# Altium footprint library Connectors.PcbLib: 43 footprints (part 3 of 3)
Each footprint in its own frame and in the unit in brackets; x right, y up, seen from the top. Pads: shape width x height; smd on the part's side, far side on the other; paste and mask are expansions set on the pad; w line width, h text height; cw(c..) or ccw(c..) is an arc to the next point about the centre after c.
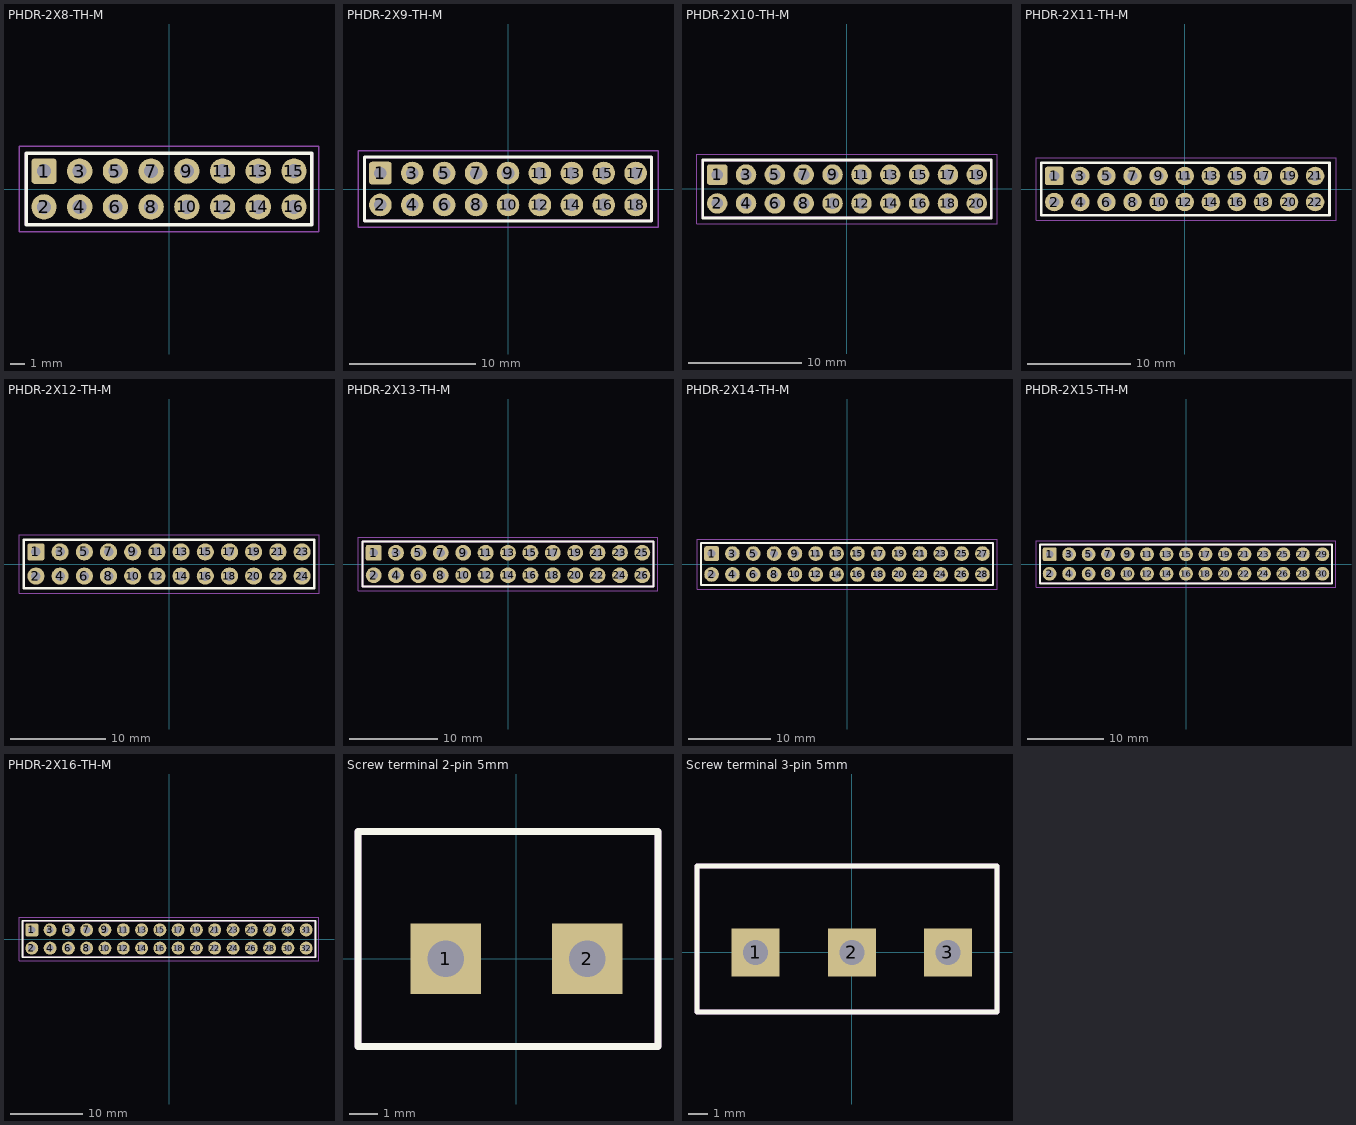
[diagram p2: the footprints below, top view; thin cyan lines are the x and y axes]

## PHDR-2X8-TH-M [mm] "PinHeader 2x8 TH Pitch 2.54mm"
height 9.5
pads (16):
  rrect25% 1.8x1.8 hole 1: 1(-8.89,1.27)
  round 1.8 hole 1: 2(-8.89,-1.27) 3(-6.35,1.27) 4(-6.35,-1.27) 5(-3.81,1.27) 6(-3.81,-1.27) 7(-1.27,1.27) 8(-1.27,-1.27) 9(1.27,1.27) 10(1.27,-1.27) 11(3.81,1.27) 12(3.81,-1.27) 13(6.35,1.27) 14(6.35,-1.27) 15(8.89,1.27) 16(8.89,-1.27)
Top Overlay:
  lines w0.254: -7.62,2.54 -10.16,2.54 ; -10.16,2.54 -10.16,0 -10.16,-2.54 10.16,-2.54 10.16,2.54 -10.16,2.54
Top Assembly:
  circle w0.5: c-8.89,1.27 r0.15
  lines w0.2: -10.16,-2.54 -10.16,2.54 10.16,2.54 10.16,-2.54 -10.16,-2.54
Top Courtyard:
  lines w0.1: -10.668,-3.048 10.668,-3.048 10.668,3.048 -10.668,3.048 -10.668,-3.048
Top Designator:
  text ".Designator" at -7.498,-0.5 h1.5
3D body "Pin Header 2x8 TH Pitch 2.54mm.stp": height 9.5, standoff -3.2, extent -10.16,-2.54 10.16,2.54

## PHDR-2X9-TH-M [mm] "PinHeader 2x9 TH Pitch 2.54mm"
height 9.5
pads (18):
  rrect25% 1.8x1.8 hole 1: 1(-10.16,1.27)
  round 1.8 hole 1: 2(-10.16,-1.27) 3(-7.62,1.27) 4(-7.62,-1.27) 5(-5.08,1.27) 6(-5.08,-1.27) 7(-2.54,1.27) 8(-2.54,-1.27) 9(0,1.27) 10(0,-1.27) 11(2.54,1.27) 12(2.54,-1.27) 13(5.08,1.27) 14(5.08,-1.27) 15(7.62,1.27) 16(7.62,-1.27) 17(10.16,1.27) 18(10.16,-1.27)
Top Overlay:
  lines w0.254: -8.89,2.54 -11.43,2.54 ; -11.43,2.54 11.43,2.54 11.43,-2.54 -11.43,-2.54 -11.43,0 -11.43,2.54
Top Assembly:
  circle w0.5: c-10.16,1.27 r0.15
  lines w0.2: -11.43,-2.54 -11.43,2.54 11.43,2.54 11.43,-2.54 -11.43,-2.54
Top Courtyard:
  lines w0.1: -11.938,-3.048 -11.938,3.048 11.938,3.048 11.938,-3.048 -11.938,-3.048
Top Designator:
  text ".Designator" at -7.498,-0.5 h1.5
3D body "Pin Header 2x9 TH Pitch 2.54mm.stp": height 9.5, standoff -3.2, extent -11.43,-2.54 11.43,2.54

## PHDR-2X10-TH-M [mm] "PinHeader 2x10 TH Pitch 2.54mm"
height 9.5
pads (20):
  rrect25% 1.8x1.8 hole 1: 1(-11.43,1.27)
  round 1.8 hole 1: 2(-11.43,-1.27) 3(-8.89,1.27) 4(-8.89,-1.27) 5(-6.35,1.27) 6(-6.35,-1.27) 7(-3.81,1.27) 8(-3.81,-1.27) 9(-1.27,1.27) 10(-1.27,-1.27) 11(1.27,1.27) 12(1.27,-1.27) 13(3.81,1.27) 14(3.81,-1.27) 15(6.35,1.27) 16(6.35,-1.27) 17(8.89,1.27) 18(8.89,-1.27) 19(11.43,1.27) 20(11.43,-1.27)
Top Overlay:
  lines w0.254: -10.16,2.54 -12.7,2.54 ; -12.7,2.54 12.7,2.54 12.7,-2.54 -12.7,-2.54 -12.7,0 -12.7,2.54
Top Assembly:
  circle w0.5: c-11.43,1.27 r0.15
  lines w0.2: -12.7,-2.54 12.7,-2.54 12.7,2.54 -12.7,2.54 -12.7,-2.54
Top Courtyard:
  lines w0.1: -13.208,-3.048 13.208,-3.048 13.208,3.048 -13.208,3.048 -13.208,-3.048
Top Designator:
  text ".Designator" at -7.498,-0.5 h1.5
3D body "Pin Header 2x10 TH Pitch 2.54mm.stp": height 9.5, standoff -3.2, extent -12.7,-2.54 12.7,2.54

## PHDR-2X11-TH-M [mm] "PinHeader 2x11 TH Pitch 2.54mm"
height 9.5
pads (22):
  rrect25% 1.8x1.8 hole 1: 1(-12.7,1.27)
  round 1.8 hole 1: 2(-12.7,-1.27) 3(-10.16,1.27) 4(-10.16,-1.27) 5(-7.62,1.27) 6(-7.62,-1.27) 7(-5.08,1.27) 8(-5.08,-1.27) 9(-2.54,1.27) 10(-2.54,-1.27) 11(0,1.27) 12(0,-1.27) 13(2.54,1.27) 14(2.54,-1.27) 15(5.08,1.27) 16(5.08,-1.27) 17(7.62,1.27) 18(7.62,-1.27) 19(10.16,1.27) 20(10.16,-1.27) 21(12.7,1.27) 22(12.7,-1.27)
Top Overlay:
  lines w0.254: -11.43,2.54 -13.97,2.54 ; -13.97,2.54 -13.97,0 -13.97,-2.54 14.097,-2.54 14.097,2.54 -13.97,2.54
Top Assembly:
  circle w0.5: c-12.7,1.27 r0.15
  lines w0.2: -13.97,-2.54 14.097,-2.54 14.097,2.54 -13.97,2.54 -13.97,-2.54
Top Courtyard:
  lines w0.1: -14.478,-3.048 14.732,-3.048 14.732,3.048 -14.478,3.048 -14.478,-3.048
Top Designator:
  text ".Designator" at -7.498,-0.5 h1.5
3D body "Pin Header 2x11 TH Pitch 2.54mm.stp": height 9.5, standoff -3.2, extent -13.97,-2.54 13.97,2.54

## PHDR-2X12-TH-M [mm] "PinHeader 2x12 TH Pitch 2.54mm"
height 9.5
pads (24):
  rrect25% 1.8x1.8 hole 1: 1(-13.97,1.27)
  round 1.8 hole 1: 2(-13.97,-1.27) 3(-11.43,1.27) 4(-11.43,-1.27) 5(-8.89,1.27) 6(-8.89,-1.27) 7(-6.35,1.27) 8(-6.35,-1.27) 9(-3.81,1.27) 10(-3.81,-1.27) 11(-1.27,1.27) 12(-1.27,-1.27) 13(1.27,1.27) 14(1.27,-1.27) 15(3.81,1.27) 16(3.81,-1.27) 17(6.35,1.27) 18(6.35,-1.27) 19(8.89,1.27) 20(8.89,-1.27) 21(11.43,1.27) 22(11.43,-1.27) 23(13.97,1.27) 24(13.97,-1.27)
Top Overlay:
  lines w0.254: -12.7,2.54 -15.24,2.54 ; -15.24,2.54 -15.24,0 -15.24,-2.54 15.24,-2.54 15.24,2.54 -15.24,2.54
Top Assembly:
  circle w0.5: c-13.97,1.27 r0.15
  lines w0.2: -15.24,-2.54 -15.24,2.54 15.24,2.54 15.24,-2.54 -15.24,-2.54
Top Courtyard:
  lines w0.1: -15.748,-3.048 -15.748,3.048 15.748,3.048 15.748,-3.048 -15.748,-3.048
Top Designator:
  text ".Designator" at -7.498,-0.5 h1.5
3D body "Pin Header 2x12 TH Pitch 2.54mm.stp": height 9.5, standoff -3.2, extent -15.24,-2.54 15.24,2.54

## PHDR-2X13-TH-M [mm] "PinHeader 2x13 TH Pitch 2.54mm"
height 9.5
pads (26):
  rrect25% 1.8x1.8 hole 1: 1(-15.24,1.27)
  round 1.8 hole 1: 2(-15.24,-1.27) 3(-12.7,1.27) 4(-12.7,-1.27) 5(-10.16,1.27) 6(-10.16,-1.27) 7(-7.62,1.27) 8(-7.62,-1.27) 9(-5.08,1.27) 10(-5.08,-1.27) 11(-2.54,1.27) 12(-2.54,-1.27) 13(0,1.27) 14(0,-1.27) 15(2.54,1.27) 16(2.54,-1.27) 17(5.08,1.27) 18(5.08,-1.27) 19(7.62,1.27) 20(7.62,-1.27) 21(10.16,1.27) 22(10.16,-1.27) 23(12.7,1.27) 24(12.7,-1.27) 25(15.24,1.27) 26(15.24,-1.27)
Top Overlay:
  lines w0.254: -13.97,2.54 -16.51,2.54 ; -16.51,2.54 -16.51,0 -16.51,-2.54 16.51,-2.54 16.51,2.54 -16.51,2.54
Top Assembly:
  circle w0.5: c-15.24,1.27 r0.15
  lines w0.2: -16.51,-2.54 16.51,-2.54 16.51,2.54 -16.51,2.54 -16.51,-2.54
Top Courtyard:
  lines w0.1: -17.018,-3.048 17.018,-3.048 17.018,3.048 -17.018,3.048 -17.018,-3.048
Top Designator:
  text ".Designator" at -7.498,-0.5 h1.5
3D body "Pin Header 2x13 TH Pitch 2.54mm.stp": height 9.5, standoff -3.2, extent -16.51,-2.54 16.51,2.54

## PHDR-2X14-TH-M [mm] "PinHeader 2x14 TH Pitch 2.54mm"
height 9.5
pads (28):
  rrect25% 1.8x1.8 hole 1: 1(-16.51,1.27)
  round 1.8 hole 1: 2(-16.51,-1.27) 3(-13.97,1.27) 4(-13.97,-1.27) 5(-11.43,1.27) 6(-11.43,-1.27) 7(-8.89,1.27) 8(-8.89,-1.27) 9(-6.35,1.27) 10(-6.35,-1.27) 11(-3.81,1.27) 12(-3.81,-1.27) 13(-1.27,1.27) 14(-1.27,-1.27) 15(1.27,1.27) 16(1.27,-1.27) 17(3.81,1.27) 18(3.81,-1.27) 19(6.35,1.27) 20(6.35,-1.27) 21(8.89,1.27) 22(8.89,-1.27) 23(11.43,1.27) 24(11.43,-1.27) 25(13.97,1.27) 26(13.97,-1.27) 27(16.51,1.27) 28(16.51,-1.27)
Top Overlay:
  lines w0.254: -15.24,2.54 -17.78,2.54 ; -17.78,2.54 17.78,2.54 17.78,-2.54 -17.78,-2.54 -17.78,0 -17.78,2.54
Top Assembly:
  circle w0.5: c-16.51,1.27 r0.15
  lines w0.2: -17.78,-2.54 -17.78,2.54 17.78,2.54 17.78,-2.54 -17.78,-2.54
Top Courtyard:
  lines w0.1: -18.288,-3.048 -18.288,3.048 18.288,3.048 18.288,-3.048 -18.288,-3.048
Top Designator:
  text ".Designator" at -7.498,-0.5 h1.5
3D body "Pin Header 2x14 TH Pitch 2.54mm.stp": height 9.5, standoff -3.2, extent -17.78,-2.54 17.78,2.54

## PHDR-2X15-TH-M [mm] "PinHeader 2x15 TH Pitch 2.54mm"
height 9.5
pads (30):
  rrect25% 1.8x1.8 hole 1: 1(-17.78,1.27)
  round 1.8 hole 1: 2(-17.78,-1.27) 3(-15.24,1.27) 4(-15.24,-1.27) 5(-12.7,1.27) 6(-12.7,-1.27) 7(-10.16,1.27) 8(-10.16,-1.27) 9(-7.62,1.27) 10(-7.62,-1.27) 11(-5.08,1.27) 12(-5.08,-1.27) 13(-2.54,1.27) 14(-2.54,-1.27) 15(0,1.27) 16(0,-1.27) 17(2.54,1.27) 18(2.54,-1.27) 19(5.08,1.27) 20(5.08,-1.27) 21(7.62,1.27) 22(7.62,-1.27) 23(10.16,1.27) 24(10.16,-1.27) 25(12.7,1.27) 26(12.7,-1.27) 27(15.24,1.27) 28(15.24,-1.27) 29(17.78,1.27) 30(17.78,-1.27)
Top Overlay:
  lines w0.254: -16.51,2.54 -19.05,2.54 ; -19.05,2.54 -19.05,0 -19.05,-2.54 19.05,-2.54 19.05,2.54 -19.05,2.54
Top Assembly:
  circle w0.5: c-17.78,1.27 r0.15
  lines w0.2: -19.05,-2.54 19.05,-2.54 19.05,2.54 -19.05,2.54 -19.05,-2.54
Top Courtyard:
  lines w0.1: -19.558,-3.048 19.558,-3.048 19.558,3.048 -19.558,3.048 -19.558,-3.048
Top Designator:
  text ".Designator" at -7.498,-0.5 h1.5
3D body "Pin Header 2x15 TH Pitch 2.54mm.stp": height 9.5, standoff -3.2, extent -19.05,-2.54 19.05,2.54

## PHDR-2X16-TH-M [mm] "PinHeader 2x16 TH Pitch 2.54mm"
height 9.5
pads (32):
  rrect25% 1.8x1.8 hole 1: 1(-19.05,1.27)
  round 1.8 hole 1: 2(-19.05,-1.27) 3(-16.51,1.27) 4(-16.51,-1.27) 5(-13.97,1.27) 6(-13.97,-1.27) 7(-11.43,1.27) 8(-11.43,-1.27) 9(-8.89,1.27) 10(-8.89,-1.27) 11(-6.35,1.27) 12(-6.35,-1.27) 13(-3.81,1.27) 14(-3.81,-1.27) 15(-1.27,1.27) 16(-1.27,-1.27) 17(1.27,1.27) 18(1.27,-1.27) 19(3.81,1.27) 20(3.81,-1.27) 21(6.35,1.27) 22(6.35,-1.27) 23(8.89,1.27) 24(8.89,-1.27) 25(11.43,1.27) 26(11.43,-1.27) 27(13.97,1.27) 28(13.97,-1.27) 29(16.51,1.27) 30(16.51,-1.27) 31(19.05,1.27) 32(19.05,-1.27)
Top Overlay:
  lines w0.254: -17.78,2.54 -20.32,2.54 ; -20.32,2.54 -20.32,0 -20.32,-2.54 20.32,-2.54 20.32,2.54 -20.32,2.54
Top Assembly:
  circle w0.5: c-19.05,1.27 r0.15
  lines w0.2: -20.32,-2.54 -20.32,2.54 20.32,2.54 20.32,-2.54 -20.32,-2.54
Top Courtyard:
  lines w0.1: -20.828,-3.048 20.828,-3.048 20.828,3.048 -20.828,3.048 -20.828,-3.048
Top Designator:
  text ".Designator" at -7.498,-0.5 h1.5
3D body "Pin Header 2x16 TH Pitch 2.54mm.stp": height 9.5, standoff -3.2, extent -20.32,-2.54 20.32,2.54

## Screw terminal 2-pin 5mm [mm] "DG301-5.0-02"
pads (2):
  rect 2.5x2.5 hole 1.3: 1(-2.5,0) 2(2.5,0)
Top Overlay:
  lines w0.254: -5.6,-3.1 5,-3.1 5,4.5 -5.6,4.5 -5.6,-3.1
Top Designator:
  text ".Designator" at -7.618,-0.508 h1.52
Bottom Courtyard:
  lines w0.254: -5.6,-3.1 5,-3.1 5,4.5 -5.6,4.5 -5.6,-3.1
3D body "DG301-5.0-02.stp": height 10, standoff -4.4, extent -5.6,-3.1 5,4.5

## Screw terminal 3-pin 5mm [mm] "DG301-5.0-03"
pads (3):
  rect 2.5x2.5 hole 1.3: 1(-5,0) 2(0,0) 3(5,0)
Top Overlay:
  lines w0.254: -8.05,-3.1 -8.05,4.5 7.55,4.5 7.55,-3.1 -8.05,-3.1
Top Designator:
  text ".Designator" at -7.618,-0.508 h1.52
Bottom Courtyard:
  lines w0.254: -8.05,-3.1 7.55,-3.1 7.55,4.5 -8.05,4.5 -8.05,-3.1
3D body "DG301-5.0-03.stp": height 10, standoff -4.4, extent -8.05,-3.1 7.55,4.5